# Altium footprint library Connectors.PcbLib: 56 footprints (part 1 of 4)
Each footprint in its own frame and in the unit in brackets; x right, y up, seen from the top. Pads: shape width x height; smd on the part's side, far side on the other; paste and mask are expansions set on the pad; w line width, h text height; cw(c..) or ccw(c..) is an arc to the next point about the centre after c.
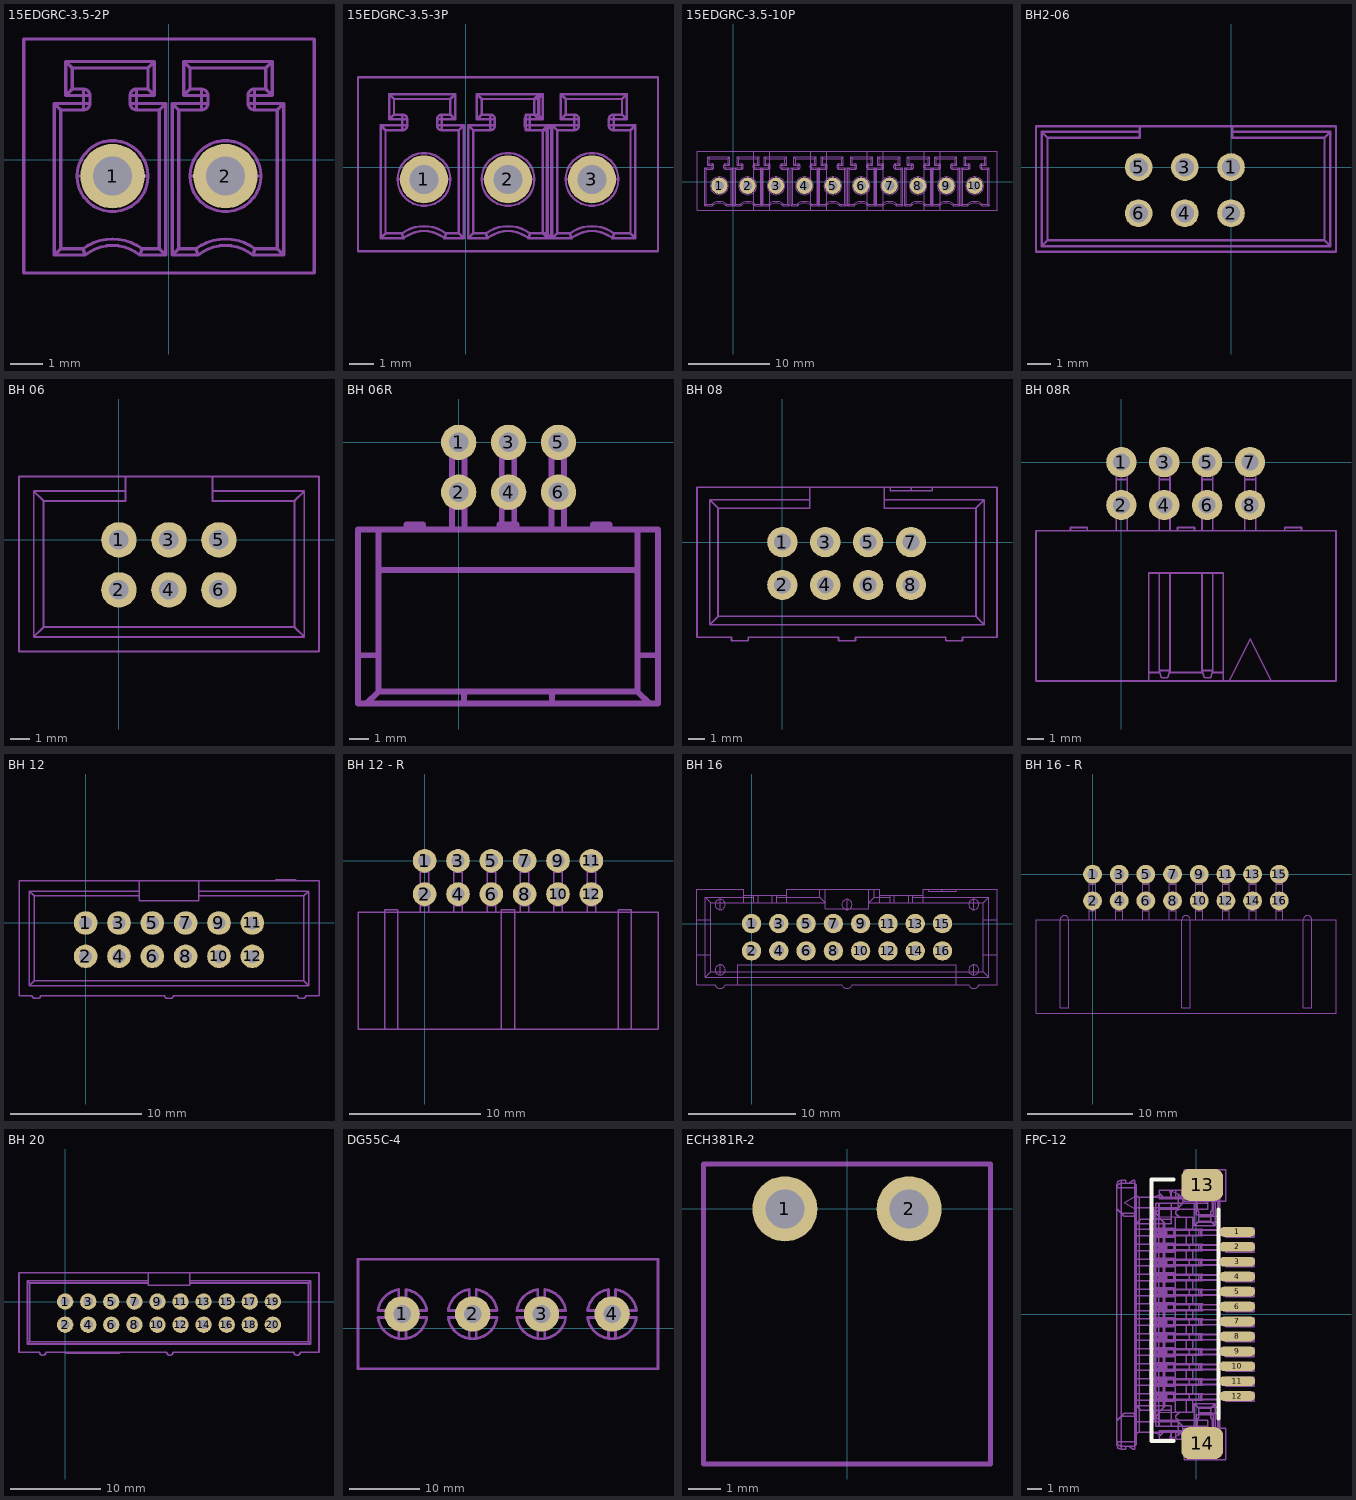
[diagram p0: the footprints below, top view; thin cyan lines are the x and y axes]

## 15EDGRC-3.5-2P [mm]
pads (2):
  round 2 hole 1.2: 1(-1.75,-0.5) 2(1.75,-0.5)
Mechanical 13:
  drawing of 660 lines, arcs and shapes, not listed
3D body "12h8910_284514-2.stp": height 9.5, standoff -3.1, extent -4.5,-3.5 4.5,3.75

## 15EDGRC-3.5-3P [mm]
pads (3):
  round 2 hole 1.2: 1(-1.75,-0.5) 2(1.75,-0.5) 3(5.25,-0.5)
Mechanical 13:
  drawing of 1141 lines, arcs and shapes, not listed
3D body "12h8910_284514-2.stp": height 9.5, standoff -3.1, extent -1,-3.5 8,3.75
3D body "12h8910_284514-2.stp": height 9.5, standoff -3.1, extent -4.5,-3.5 4.5,3.75

## 15EDGRC-3.5-10P [mm]
pads (10):
  round 2 hole 1.2: 1(-1.75,-0.5) 2(1.75,-0.5) 3(5.25,-0.5) 4(8.75,-0.5) 5(12.25,-0.5) 6(15.75,-0.5) 7(19.25,-0.5) 8(22.75,-0.5) 9(26.25,-0.5) 10(29.75,-0.5)
Mechanical 13:
  drawing of 3300 lines, arcs and shapes, not listed
3D body: height 0.25, standoff 0, extent 0,0 0,0
3D body "12h8910_284514-2.stp": height 9.5, standoff -3.1, extent -4.5,-3.5 4.5,3.75
3D body "12h8910_284514-2.stp": height 9.5, standoff -3.1, extent 2.5,-3.5 11.5,3.75
3D body "12h8910_284514-2.stp": height 9.5, standoff -3.1, extent 9.5,-3.5 18.5,3.75
3D body "12h8910_284514-2.stp": height 9.5, standoff -3.1, extent 16.5,-3.5 25.5,3.75
3D body "12h8910_284514-2.stp": height 9.5, standoff -3.1, extent 23.5,-3.5 32.5,3.75

## BH2-06 [mm]
pads (6):
  round 1.2 hole 0.8 paste-25.4: 1(0,0) 2(0,-2) 3(-2,0) 4(-2,-2) 5(-4,0) 6(-4,-2)
Mechanical 13:
  lines w0.1: 4,1.275 0.05,1.275 0.05,1.525 ; -8.2,-3.425 4.3,-3.425 ; -8.2,-3.425 -8.2,1.525 ; -8.2,-3.425 -7.95,-3.175 ; -8.2,1.525 -3.95,1.525 ; -8.2,1.525 -7.95,1.275 ; -7.95,-3.175 -7.95,1.275 ; -7.95,-3.175 4.05,-3.175 ; -7.95,1.275 -3.95,1.275 -3.95,1.525 ; -4.2,-2.2 -3.7,-2.2 ; -4.2,-2.2 -4.05,-2.05 ; -4.2,-2.2 -4.2,-1.7 ; -4.2,-1.7 -4.05,-1.85 ; -4.2,-1.7 -3.7,-1.7 ; -4.2,-0.2 -3.7,-0.2 ; -4.2,-0.2 -4.05,-0.05 ; -4.2,-0.2 -4.2,0.3 ; -4.2,0.3 -4.05,0.15 ; -4.2,0.3 -3.7,0.3 ; -4.05,-2.05 -3.85,-2.05 ; -4.05,-2.05 -4.05,-1.85 ; -4.05,-1.85 -3.85,-1.85 ; -4.05,-0.05 -3.85,-0.05 ; -4.05,-0.05 -4.05,0.15 ; -4.05,0.15 -3.85,0.15 ; -3.95,1.525 -3.95,1.775 ; -3.95,1.775 -8.45,1.775 -8.45,-3.675 4.55,-3.675 4.55,1.775 0.05,1.775 ; -3.95,1.775 0.05,1.775 ; -3.85,-2.05 -3.7,-2.2 ; -3.85,-2.05 -3.85,-1.85 ; -3.85,-1.85 -3.7,-1.7 ; -3.85,-0.05 -3.7,-0.2 ; -3.85,-0.05 -3.85,0.15 ; -3.85,0.15 -3.7,0.3 ; -3.7,-2.2 -3.7,-1.7 ; -3.7,-0.2 -3.7,0.3 ; -2.2,-2.2 -1.7,-2.2 ; -2.2,-2.2 -2.05,-2.05 ; -2.2,-2.2 -2.2,-1.7 ; -2.2,-1.7 -2.05,-1.85 ; -2.2,-1.7 -1.7,-1.7 ; -2.2,-0.2 -1.7,-0.2 ; -2.2,-0.2 -2.05,-0.05 ; -2.2,-0.2 -2.2,0.3 ; -2.2,0.3 -2.05,0.15 ; -2.2,0.3 -1.7,0.3 ; -2.05,-2.05 -1.85,-2.05 ; -2.05,-2.05 -2.05,-1.85 ; -2.05,-1.85 -1.85,-1.85 ; -2.05,-0.05 -1.85,-0.05 ; -2.05,-0.05 -2.05,0.15 ; -2.05,0.15 -1.85,0.15 ; -1.85,-2.05 -1.7,-2.2 ; -1.85,-2.05 -1.85,-1.85 ; -1.85,-1.85 -1.7,-1.7 ; -1.85,-0.05 -1.7,-0.2 ; -1.85,-0.05 -1.85,0.15 ; -1.85,0.15 -1.7,0.3 ; -1.7,-2.2 -1.7,-1.7 ; -1.7,-0.2 -1.7,0.3 ; -0.2,-2.2 -0.2,-1.7 ; -0.2,-2.2 -0.05,-2.05 ; -0.2,-2.2 0.3,-2.2 ; -0.2,-1.7 -0.05,-1.85 ; -0.2,-1.7 0.3,-1.7 ; -0.2,-0.2 -0.2,0.3 ; -0.2,-0.2 -0.05,-0.05 ; -0.2,-0.2 0.3,-0.2 ; -0.2,0.3 -0.05,0.15 ; -0.2,0.3 0.3,0.3 ; -0.05,-2.05 -0.05,-1.85 ; -0.05,-2.05 0.15,-2.05 ; -0.05,-1.85 0.15,-1.85 ; -0.05,-0.05 -0.05,0.15 ; -0.05,-0.05 0.15,-0.05 ; -0.05,0.15 0.15,0.15 ; 0.05,1.525 4.3,1.525 ; 0.05,1.525 0.05,1.775 ; 0.15,-2.05 0.3,-2.2 ; 0.15,-2.05 0.15,-1.85 ; 0.15,-1.85 0.3,-1.7 ; 0.15,-0.05 0.3,-0.2 ; 0.15,-0.05 0.15,0.15 ; 0.15,0.15 0.3,0.3 ; 0.3,-2.2 0.3,-1.7 ; 0.3,-0.2 0.3,0.3 ; 4.05,-3.175 4.3,-3.425 ; 4.05,-3.175 4.05,1.275 4.3,1.525 ; 4.3,-3.425 4.3,1.525

## BH 06 [mm]
pads (6):
  round 1.8 hole 1 paste-25.4: 1(0,0) 2(0,-2.54) 3(2.54,0) 4(2.54,-2.54) 5(5.08,0) 6(5.08,-2.54)
Mechanical 13:
  lines w0.1: -4.325,-4.928 -4.325,2.472 ; -4.325,-4.928 9.415,-4.928 ; -4.325,-4.928 -3.825,-4.428 ; -4.325,2.472 0.345,2.472 ; -4.325,2.472 -3.825,1.972 ; -3.825,-4.428 -3.825,1.972 ; -3.825,-4.428 8.915,-4.428 ; -3.825,1.972 0.345,1.972 0.345,2.472 ; -0.315,-2.818 -0.187,-2.69 ; -0.315,-2.818 0.325,-2.818 ; -0.315,-2.818 -0.315,-2.178 ; -0.315,-2.178 -0.187,-2.306 ; -0.315,-2.178 0.325,-2.178 ; -0.315,-0.278 -0.187,-0.15 ; -0.315,-0.278 0.325,-0.278 ; -0.315,-0.278 -0.315,0.362 ; -0.315,0.362 -0.187,0.234 ; -0.315,0.362 0.325,0.362 ; -0.187,-2.69 0.197,-2.69 ; -0.187,-2.69 -0.187,-2.306 ; -0.187,-2.306 0.197,-2.306 ; -0.187,-0.15 0.197,-0.15 ; -0.187,-0.15 -0.187,0.234 ; -0.187,0.234 0.197,0.234 ; 0.197,-2.69 0.325,-2.818 ; 0.197,-2.69 0.197,-2.306 ; 0.197,-2.306 0.325,-2.178 ; 0.197,-0.15 0.325,-0.278 ; 0.197,-0.15 0.197,0.234 ; 0.197,0.234 0.325,0.362 ; 0.325,-2.818 0.325,-2.178 ; 0.325,-0.278 0.325,0.362 ; 0.345,2.472 0.345,3.222 ; 0.345,3.222 -5.075,3.222 -5.075,-5.678 10.165,-5.678 10.165,3.222 4.745,3.222 ; 0.345,3.222 4.745,3.222 ; 2.225,-2.818 2.353,-2.69 ; 2.225,-2.818 2.865,-2.818 ; 2.225,-2.818 2.225,-2.178 ; 2.225,-2.178 2.353,-2.306 ; 2.225,-2.178 2.865,-2.178 ; 2.225,-0.278 2.353,-0.15 ; 2.225,-0.278 2.865,-0.278 ; 2.225,-0.278 2.225,0.362 ; 2.225,0.362 2.353,0.234 ; 2.225,0.362 2.865,0.362 ; 2.353,-2.69 2.737,-2.69 ; 2.353,-2.69 2.353,-2.306 ; 2.353,-2.306 2.737,-2.306 ; 2.353,-0.15 2.737,-0.15 ; 2.353,-0.15 2.353,0.234 ; 2.353,0.234 2.737,0.234 ; 2.737,-2.69 2.865,-2.818 ; 2.737,-2.69 2.737,-2.306 ; 2.737,-2.306 2.865,-2.178 ; 2.737,-0.15 2.865,-0.278 ; 2.737,-0.15 2.737,0.234 ; 2.737,0.234 2.865,0.362 ; 2.865,-2.818 2.865,-2.178 ; 2.865,-0.278 2.865,0.362 ; 4.745,2.472 9.415,2.472 ; 4.745,2.472 4.745,3.222 ; 4.745,2.472 4.745,1.972 8.915,1.972 ; 4.765,-2.818 4.893,-2.69 ; 4.765,-2.818 5.405,-2.818 ; 4.765,-2.818 4.765,-2.178 ; 4.765,-2.178 4.893,-2.306 ; 4.765,-2.178 5.405,-2.178 ; 4.765,-0.278 4.893,-0.15 ; 4.765,-0.278 5.405,-0.278 ; 4.765,-0.278 4.765,0.362 ; 4.765,0.362 4.893,0.234 ; 4.765,0.362 5.405,0.362 ; 4.893,-2.69 5.277,-2.69 ; 4.893,-2.69 4.893,-2.306 ; 4.893,-2.306 5.277,-2.306 ; 4.893,-0.15 5.277,-0.15 ; 4.893,-0.15 4.893,0.234 ; 4.893,0.234 5.277,0.234 ; 5.277,-2.69 5.405,-2.818 ; 5.277,-2.69 5.277,-2.306 ; 5.277,-2.306 5.405,-2.178 ; 5.277,-0.15 5.405,-0.278 ; 5.277,-0.15 5.277,0.234 ; 5.277,0.234 5.405,0.362 ; 5.405,-2.818 5.405,-2.178 ; 5.405,-0.278 5.405,0.362 ; 8.915,-4.428 9.415,-4.928 ; 8.915,-4.428 8.915,1.972 ; 8.915,1.972 9.415,2.472 ; 9.415,-4.928 9.415,2.472
3D body "User Library-BH_06.STEP": height 9.73, standoff -2.37, extent -5.08,-5.678 10.16,3.222

## BH 06R [mm]
pads (6):
  round 1.8 hole 1 paste-25.4: 1(0,0) 2(0,-2.54) 3(2.54,0) 4(2.54,-2.54) 5(5.08,0) 6(5.08,-2.54)
Mechanical 13:
  lines w0.3: -5.13,-10.845 -4.08,-10.845 ; -4.68,-13.295 -4.08,-12.695 ; -4.08,-4.445 -4.08,-6.495 ; -2.665,-4.445 -2.665,-4.195 -1.815,-4.195 -1.815,-4.445 ; -0.35,-4.445 -0.35,-3.285 ; 0.26,-13.295 0.26,-12.695 -4.08,-12.695 ; 0.29,-4.445 0.29,-3.285 ; 2.085,-4.445 2.085,-4.195 2.935,-4.195 2.935,-4.445 ; 2.19,-4.195 2.19,-3.285 ; 2.83,-4.195 2.83,-3.285 ; 4.73,-4.445 4.73,-3.285 ; 4.76,-13.295 4.76,-12.695 9.1,-12.695 ; 5.37,-4.445 5.37,-3.285 ; 6.835,-4.445 6.835,-4.195 7.685,-4.195 7.685,-4.445 ; 9.1,-10.845 10.15,-10.845 ; 9.1,-4.445 9.1,-6.495 ; 9.7,-13.295 9.1,-12.695 ; -4.08,-12.695 -4.08,-6.495 ; -4.08,-12.695 9.1,-12.695 ; -4.08,-6.495 9.1,-6.495 ; -0.35,-3.285 0.29,-3.285 ; -0.35,-3.285 -0.35,-2.925 ; -0.35,-3.285 0.29,-3.285 ; -0.35,-2.925 -0.15,-2.725 ; -0.35,-2.925 0.29,-2.925 ; -0.35,-2.925 -0.35,-2.285 ; -0.35,-2.285 -0.35,-0.745 ; -0.35,-2.285 -0.15,-2.485 ; -0.35,-2.285 0.29,-2.285 ; -0.35,-0.745 0.29,-0.745 ; -0.35,-0.745 -0.35,-0.385 ; -0.35,-0.745 0.29,-0.745 ; -0.35,-0.385 0.29,-0.385 ; -0.35,-0.385 -0.15,-0.185 ; -0.35,-0.385 -0.35,0.255 ; -0.35,0.255 -0.15,0.055 ; -0.35,0.255 0.29,0.255 ; -0.15,-2.725 -0.15,-2.485 ; -0.15,-2.725 0.09,-2.725 ; -0.15,-2.485 0.09,-2.485 ; -0.15,-0.185 0.09,-0.185 ; -0.15,-0.185 -0.15,0.055 ; -0.15,0.055 0.09,0.055 ; 0.09,-2.725 0.09,-2.485 ; 0.09,-2.725 0.29,-2.925 ; 0.09,-2.485 0.29,-2.285 ; 0.09,-0.185 0.29,-0.385 ; 0.09,-0.185 0.09,0.055 ; 0.09,0.055 0.29,0.255 ; 0.29,-3.285 0.29,-2.925 ; 0.29,-2.925 0.29,-2.285 ; 0.29,-2.285 0.29,-0.745 ; 0.29,-0.745 0.29,-0.385 ; 0.29,-0.385 0.29,0.255 ; 2.19,-3.285 2.83,-3.285 ; 2.19,-3.285 2.19,-2.925 ; 2.19,-3.285 2.83,-3.285 ; 2.19,-2.925 2.39,-2.725 ; 2.19,-2.925 2.83,-2.925 ; 2.19,-2.925 2.19,-2.285 ; 2.19,-2.285 2.19,-0.745 ; 2.19,-2.285 2.39,-2.485 ; 2.19,-2.285 2.83,-2.285 ; 2.19,-0.745 2.83,-0.745 ; 2.19,-0.745 2.19,-0.385 ; 2.19,-0.745 2.83,-0.745 ; 2.19,-0.385 2.83,-0.385 ; 2.19,-0.385 2.39,-0.185 ; 2.19,-0.385 2.19,0.255 ; 2.19,0.255 2.39,0.055 ; 2.19,0.255 2.83,0.255 ; 2.39,-2.725 2.39,-2.485 ; 2.39,-2.725 2.63,-2.725 ; 2.39,-2.485 2.63,-2.485 ; 2.39,-0.185 2.63,-0.185 ; 2.39,-0.185 2.39,0.055 ; 2.39,0.055 2.63,0.055 ; 2.63,-2.725 2.63,-2.485 ; 2.63,-2.725 2.83,-2.925 ; 2.63,-2.485 2.83,-2.285 ; 2.63,-0.185 2.83,-0.385 ; 2.63,-0.185 2.63,0.055 ; 2.63,0.055 2.83,0.255 ; 2.83,-3.285 2.83,-2.925 ; 2.83,-2.925 2.83,-2.285 ; 2.83,-2.285 2.83,-0.745 ; 2.83,-0.745 2.83,-0.385 ; 2.83,-0.385 2.83,0.255 ; 4.73,-3.285 5.37,-3.285 ; 4.73,-3.285 4.73,-2.925 ; 4.73,-3.285 5.37,-3.285 ; 4.73,-2.925 4.93,-2.725 ; 4.73,-2.925 5.37,-2.925 ; 4.73,-2.925 4.73,-2.285 ; 4.73,-2.285 4.73,-0.745 ; 4.73,-2.285 4.93,-2.485 ; 4.73,-2.285 5.37,-2.285 ; 4.73,-0.745 5.37,-0.745 ; 4.73,-0.745 4.73,-0.385 ; 4.73,-0.745 5.37,-0.745 ; 4.73,-0.385 5.37,-0.385 ; 4.73,-0.385 4.93,-0.185 ; 4.73,-0.385 4.73,0.255 ; 4.73,0.255 4.93,0.055 ; 4.73,0.255 5.37,0.255 ; 4.93,-2.725 4.93,-2.485 ; 4.93,-2.725 5.17,-2.725 ; 4.93,-2.485 5.17,-2.485 ; 4.93,-0.185 5.17,-0.185 ; 4.93,-0.185 4.93,0.055 ; 4.93,0.055 5.17,0.055 ; 5.17,-2.725 5.17,-2.485 ; 5.17,-2.725 5.37,-2.925 ; 5.17,-2.485 5.37,-2.285 ; 5.17,-0.185 5.37,-0.385 ; 5.17,-0.185 5.17,0.055 ; 5.17,0.055 5.37,0.255 ; 5.37,-3.285 5.37,-2.925 ; 5.37,-2.925 5.37,-2.285 ; 5.37,-2.285 5.37,-0.745 ; 5.37,-0.745 5.37,-0.385 ; 5.37,-0.385 5.37,0.255 ; 9.1,-12.695 9.1,-6.495 ; -5.13,-13.295 -5.13,-4.445 -2.98,-4.445 -2.33,-4.445 7.35,-4.445 8,-4.445 10.15,-4.445 10.15,-13.295 8,-13.295 7.35,-13.295 -2.33,-13.295 -2.98,-13.295 -5.13,-13.295
3D body "65715.stp": height 9.43, standoff -2.4, extent -5.1,-13.295 10.18,0.255

## BH 08 [mm]
pads (8):
  round 1.8 hole 1: 1(0,0) 2(0,-2.54) 3(2.54,0) 4(2.54,-2.54) 5(5.08,0) 6(5.08,-2.54) 7(7.62,0) 8(7.62,-2.54)
Mechanical 13:
  lines w0.1: 7.639,3.054 7.639,3.254 ; -4.311,-4.896 -3.811,-4.396 ; -4.311,-4.896 11.969,-4.896 ; -4.311,-4.896 -4.311,2.504 ; -4.311,2.504 -3.811,2.004 ; -4.311,2.504 1.629,2.504 ; -3.811,-4.396 11.469,-4.396 ; -3.811,-4.396 -3.811,2.004 ; -3.811,2.004 1.629,2.004 1.629,2.504 ; -0.301,-2.786 0.339,-2.786 ; -0.301,-2.786 -0.301,-2.146 ; -0.301,-2.786 -0.173,-2.658 ; -0.301,-2.146 0.339,-2.146 ; -0.301,-2.146 -0.173,-2.274 ; -0.301,-0.246 -0.301,0.394 ; -0.301,-0.246 0.339,-0.246 ; -0.301,-0.246 -0.173,-0.118 ; -0.301,0.394 0.339,0.394 ; -0.301,0.394 -0.173,0.266 ; -0.173,-2.658 0.211,-2.658 ; -0.173,-2.658 -0.173,-2.274 ; -0.173,-2.274 0.211,-2.274 ; -0.173,-0.118 -0.173,0.266 ; -0.173,-0.118 0.211,-0.118 ; -0.173,0.266 0.211,0.266 ; 0.211,-2.658 0.339,-2.786 ; 0.211,-2.658 0.211,-2.274 ; 0.211,-2.274 0.339,-2.146 ; 0.211,-0.118 0.211,0.266 ; 0.211,-0.118 0.339,-0.246 ; 0.211,0.266 0.339,0.394 ; 0.339,-2.786 0.339,-2.146 ; 0.339,-0.246 0.339,0.394 ; 1.629,2.504 1.629,3.254 ; 1.629,3.254 6.029,3.254 ; 1.629,3.254 -5.061,3.254 -5.061,-5.646 -3.021,-5.646 -3.021,-5.846 -2.021,-5.846 -2.021,-5.646 3.329,-5.646 3.329,-5.846 4.329,-5.846 4.329,-5.646 9.679,-5.646 9.679,-5.846 10.679,-5.846 10.679,-5.646 12.719,-5.646 12.719,3.254 8.889,3.254 ; 2.239,-2.786 2.879,-2.786 ; 2.239,-2.786 2.239,-2.146 ; 2.239,-2.786 2.367,-2.658 ; 2.239,-2.146 2.879,-2.146 ; 2.239,-2.146 2.367,-2.274 ; 2.239,-0.246 2.879,-0.246 ; 2.239,-0.246 2.239,0.394 ; 2.239,-0.246 2.367,-0.118 ; 2.239,0.394 2.879,0.394 ; 2.239,0.394 2.367,0.266 ; 2.367,-2.658 2.367,-2.274 ; 2.367,-2.658 2.751,-2.658 ; 2.367,-2.274 2.751,-2.274 ; 2.367,-0.118 2.751,-0.118 ; 2.367,-0.118 2.367,0.266 ; 2.367,0.266 2.751,0.266 ; 2.751,-2.658 2.879,-2.786 ; 2.751,-2.658 2.751,-2.274 ; 2.751,-2.274 2.879,-2.146 ; 2.751,-0.118 2.879,-0.246 ; 2.751,-0.118 2.751,0.266 ; 2.751,0.266 2.879,0.394 ; 2.879,-2.786 2.879,-2.146 ; 2.879,-0.246 2.879,0.394 ; 4.779,-2.786 5.419,-2.786 ; 4.779,-2.786 4.779,-2.146 ; 4.779,-2.786 4.907,-2.658 ; 4.779,-2.146 5.419,-2.146 ; 4.779,-2.146 4.907,-2.274 ; 4.779,-0.246 5.419,-0.246 ; 4.779,-0.246 4.779,0.394 ; 4.779,-0.246 4.907,-0.118 ; 4.779,0.394 5.419,0.394 ; 4.779,0.394 4.907,0.266 ; 4.907,-2.658 4.907,-2.274 ; 4.907,-2.658 5.291,-2.658 ; 4.907,-2.274 5.291,-2.274 ; 4.907,-0.118 4.907,0.266 ; 4.907,-0.118 5.291,-0.118 ; 4.907,0.266 5.291,0.266 ; 5.291,-2.658 5.419,-2.786 ; 5.291,-2.658 5.291,-2.274 ; 5.291,-2.274 5.419,-2.146 ; 5.291,-0.118 5.419,-0.246 ; 5.291,-0.118 5.291,0.266 ; 5.291,0.266 5.419,0.394 ; 5.419,-2.786 5.419,-2.146 ; 5.419,-0.246 5.419,0.394 ; 6.029,2.504 6.029,2.004 11.469,2.004 ; 6.029,2.504 6.029,3.254 ; 6.029,2.504 11.969,2.504 ; 6.029,3.254 6.389,3.254 ; 6.389,3.254 7.639,3.254 ; 6.389,3.254 6.389,3.054 8.889,3.054 8.889,3.254 ; 7.319,-2.786 7.959,-2.786 ; 7.319,-2.786 7.319,-2.146 ; 7.319,-2.786 7.447,-2.658 ; 7.319,-2.146 7.959,-2.146 ; 7.319,-2.146 7.447,-2.274 ; 7.319,-0.246 7.959,-0.246 ; 7.319,-0.246 7.319,0.394 ; 7.319,-0.246 7.447,-0.118 ; 7.319,0.394 7.959,0.394 ; 7.319,0.394 7.447,0.266 ; 7.447,-2.658 7.831,-2.658 ; 7.447,-2.658 7.447,-2.274 ; 7.447,-2.274 7.831,-2.274 ; 7.447,-0.118 7.447,0.266 ; 7.447,-0.118 7.831,-0.118 ; 7.447,0.266 7.831,0.266 ; 7.639,3.254 8.889,3.254 ; 7.831,-2.658 7.831,-2.274 ; 7.831,-2.658 7.959,-2.786 ; 7.831,-2.274 7.959,-2.146 ; 7.831,-0.118 7.831,0.266 ; 7.831,-0.118 7.959,-0.246 ; 7.831,0.266 7.959,0.394 ; 7.959,-2.786 7.959,-2.146 ; 7.959,-0.246 7.959,0.394 ; 11.469,-4.396 11.469,2.004 ; 11.469,-4.396 11.969,-4.896 ; 11.469,2.004 11.969,2.504 ; 11.969,-4.896 11.969,2.504
3D body "User Library-BH_08_V.STEP": height 8.9, standoff -3.2, extent -5.04,-5.9 12.74,3.2

## BH 08R [mm]
pads (8):
  round 1.8 hole 1: 1(0,0) 2(0,-2.54) 3(2.54,0) 4(2.54,-2.54) 5(5.08,0) 6(5.08,-2.54) 7(7.62,0) 8(7.62,-2.54)
Mechanical 13:
  lines w0.1: -3.021,-4.07 -3.021,-3.87 -2.021,-3.87 -2.021,-4.07 ; -0.301,-4.07 -0.301,-1.03 ; 0.339,-4.07 0.339,-1.03 ; 1.629,-12.47 2.277,-12.47 ; 2.239,-6.57 2.239,-12.343 ; 2.239,-4.07 2.239,-1.03 ; 2.841,-12.47 4.817,-12.47 ; 2.879,-6.57 2.879,-12.343 ; 2.879,-4.07 2.879,-1.03 ; 3.329,-4.07 3.329,-3.87 4.329,-3.87 4.329,-4.07 ; 4.779,-6.57 4.779,-12.343 ; 4.779,-4.07 4.779,-1.03 ; 5.381,-12.47 6.029,-12.47 ; 5.419,-6.57 5.419,-12.343 ; 5.419,-4.07 5.419,-1.03 ; 7.319,-4.07 7.319,-1.03 ; 7.959,-4.07 7.959,-1.03 ; 9.679,-4.07 9.679,-3.87 10.679,-3.87 10.679,-4.07 ; -0.301,-1.03 0.339,-1.03 ; -0.301,-1.03 -0.301,0.25 0.339,0.25 0.339,-1.03 ; 1.629,-12.97 6.029,-12.97 ; 1.629,-12.97 -5.061,-12.97 -5.061,-4.07 12.719,-4.07 12.719,-12.97 8.889,-12.97 ; 1.629,-12.97 1.629,-6.57 6.029,-6.57 6.029,-12.97 ; 2.239,-12.343 2.367,-12.77 2.751,-12.77 2.879,-12.343 ; 2.239,-12.343 2.879,-12.343 ; 2.239,-1.03 2.879,-1.03 ; 2.239,-1.03 2.239,0.25 2.879,0.25 2.879,-1.03 ; 4.779,-12.343 4.907,-12.77 5.291,-12.77 5.419,-12.343 ; 4.779,-12.343 5.419,-12.343 ; 4.779,-1.03 5.419,-1.03 ; 4.779,-1.03 4.779,0.25 5.419,0.25 5.419,-1.03 ; 6.029,-12.97 6.389,-12.97 ; 6.389,-12.97 8.889,-12.97 ; 6.389,-12.97 7.639,-10.47 8.889,-12.97 ; 7.319,-1.03 7.959,-1.03 ; 7.319,-1.03 7.319,0.25 7.959,0.25 7.959,-1.03
3D body "User Library-BH_08_H.STEP": height 9.45, standoff -2.62, extent -5.061,-12.97 12.719,0.25

## BH 12 [mm]
pads (12):
  round 1.8 hole 1: 1(0,0) 2(0,-2.54) 3(2.54,0) 4(2.54,-2.54) 5(5.08,0) 6(5.08,-2.54) 7(7.62,0) 8(7.62,-2.54) 9(10.16,0) 10(10.16,-2.54) 11(12.7,0) 12(12.7,-2.54)
Mechanical 13:
  drawing of 186 lines, arcs and shapes, not listed
3D body "User Library-BH-12.STEP": height 9.1, standoff -3.1, extent -5.1,-5.745 17.76,3.305

## BH 12 - R [mm]
pads (12):
  round 1.8 hole 1: 1(0,0) 2(0,-2.54) 3(2.54,0) 4(2.54,-2.54) 5(5.08,0) 6(5.08,-2.54) 7(7.62,0) 8(7.62,-2.54) 9(10.16,0) 10(10.16,-2.54) 11(12.7,0) 12(12.7,-2.54)
Mechanical 13:
  drawing of 379 lines, arcs and shapes, not listed
3D body "User Library-BH_12_H.STEP": height 9.45, standoff -2.62, extent -5.08,-12.966 17.78,0.254

## BH 16 [mm]
pads (16):
  round 1.8 hole 1: 1(0,0) 2(0,-2.54) 3(2.54,0) 4(2.54,-2.54) 5(5.08,0) 6(5.08,-2.54) 7(7.62,0) 8(7.62,-2.54) 9(10.16,0) 10(10.16,-2.54) 11(12.7,0) 12(12.7,-2.54) 13(15.24,0) 14(15.24,-2.54) 15(17.78,0) 16(17.78,-2.54)
Mechanical 13:
  drawing of 173 lines, arcs and shapes, not listed
3D body "2-1761603-6.stp": height 10, standoff -1.81, extent -5.08,-6.045 22.86,3.175

## BH 16 - R [mm]
pads (16):
  round 1.8 hole 1: 1(0,0) 2(0,-2.54) 3(2.54,0) 4(2.54,-2.54) 5(5.08,0) 6(5.08,-2.54) 7(7.62,0) 8(7.62,-2.54) 9(10.16,0) 10(10.16,-2.54) 11(12.7,0) 12(12.7,-2.54) 13(15.24,0) 14(15.24,-2.54) 15(17.78,0) 16(17.78,-2.54)
Mechanical 13:
  drawing of 294 lines, arcs and shapes, not listed
3D body "User Library-IDC Socket Male 16pin Angled THT Goldplated 2_54mm.step": height 9.98, standoff -1.37, extent -5.39,-13.335 23.17,0.225

## BH 20 [mm]
pads (20):
  round 1.8 hole 1: 1(0,0) 2(0,-2.54) 3(2.54,0) 4(2.54,-2.54) 5(5.08,0) 6(5.08,-2.54) 7(7.62,0) 8(7.62,-2.54) 9(10.16,0) 10(10.16,-2.54) 11(12.7,0) 12(12.7,-2.54) 13(15.24,0) 14(15.24,-2.54) 15(17.78,0) 16(17.78,-2.54) 17(20.32,0) 18(20.32,-2.54) 19(22.86,0) 20(22.86,-2.54)
Mechanical 13:
  drawing of 276 lines, arcs and shapes, not listed
3D body "User Library-BH-20.step": height 9.35, standoff -2.5, extent -5.01,-5.95 28.01,3.15

## DG55C-4 [mm]
pads (4):
  round 5 hole 2.5 paste-25.4: 1(-71,2) 2(-61,2) 3(-51.25,2) 4(-41.25,2)
Mechanical 13:
  lines w0.4: -74.428,1.5 ccw(c-70.964,1.995) -71.47,-1.468 ccw(c-70.964,1.995) -70.47,-1.47 ccw(c-70.964,1.995) -67.499,1.5 ; -74.427,1.5 -71.47,1.5 -71.47,-1.466 ; -74.427,2.5 cw(c-70.964,1.995) -71.47,5.459 ; -74.426,2.5 -71.47,2.5 -71.47,5.457 ; -70.47,-1.468 -70.47,1.5 -67.5,1.5 ; -70.47,5.459 -70.47,2.5 -67.501,2.5 ; -70.47,5.46 cw(c-70.964,1.995) -67.5,2.5 ; -64.47,2.5 cw(c-61.006,2.002) -61.5,5.467 ; -64.469,1.5 ccw(c-61.006,2.002) -61.5,-1.462 ccw(c-61.006,2.002) -60.5,-1.461 ccw(c-61.006,2.002) -57.542,1.5 ; -64.469,2.5 -61.5,2.5 -61.5,5.466 ; -64.468,1.5 -61.5,1.5 -61.5,-1.461 ; -60.5,-1.46 -60.5,1.5 -57.543,1.5 ; -60.5,5.464 -60.5,2.5 -57.542,2.5 ; -60.5,5.466 cw(c-61.006,2.002) -57.541,2.5 ; -54.75,1.5 ccw(c-51.285,1.995) -51.792,-1.468 ccw(c-51.285,1.995) -50.792,-1.47 ; -54.749,1.5 -51.792,1.5 -51.792,-1.466 ; -54.748,2.5 cw(c-51.285,1.995) -51.792,5.459 ; -54.747,2.5 -51.792,2.5 -51.792,5.457 ; -50.792,-1.468 -50.792,1.5 -47.821,1.5 ; -50.792,5.459 -50.792,2.5 -47.823,2.5 ; -50.792,-1.47 ccw(c-51.285,1.995) -47.82,1.5 ; -50.792,5.46 cw(c-51.285,1.995) -47.822,2.5 ; -44.72,2.5 cw(c-41.256,2.002) -41.75,5.467 ; -44.719,1.5 ccw(c-41.256,2.002) -41.75,-1.462 ccw(c-41.256,2.002) -40.75,-1.461 ccw(c-41.256,2.002) -37.792,1.5 ; -44.719,2.5 -41.75,2.5 -41.75,5.466 ; -44.718,1.5 -41.75,1.5 -41.75,-1.461 ; -40.75,-1.46 -40.75,1.5 -37.793,1.5 ; -40.75,5.464 -40.75,2.5 -37.792,2.5 ; -40.75,5.466 cw(c-41.256,2.002) -37.791,2.5 ; -77.25,-5.75 -77.25,9.75 -34.75,9.75 -34.75,-5.75 -38.75,-5.75 -77.25,-5.75
3D body "User Library-Screw terminal block 9_5mm.SLDPRT": height 18.5, standoff -5, extent -77.525,-6 -56.475,10.5
3D body "User Library-Screw terminal block 9_5mm.SLDPRT": height 18.5, standoff -5, extent -55.525,-6 -34.475,10.5

## ECH381R-2 [mm]
pads (2):
  round 2 hole 1.2: 1(-1.905,0) 2(1.905,0)
Mechanical 13:
  lines w0.15: -4.405,-7.823 -4.405,1.377 4.405,1.377 4.405,-7.823 -4.405,-7.823
3D body "20020110d021a01lf.stp": height 7.72, standoff -3.4, extent -4.405,-7.823 4.405,1.377

## FPC-12 [mm]
pads (14):
  oval 2.4x0.66 smd: 1(2.75,5.5) 2(2.75,4.5) 3(2.75,3.5) 4(2.75,2.5) 5(2.75,1.5) 6(2.75,0.5) 7(2.75,-0.5) 8(2.75,-1.5) 9(2.75,-2.5) 10(2.75,-3.5) 11(2.75,-4.5) 12(2.75,-5.5)
  rrect50% 2.794x2.134 smd: 13(0.4,8.65) 14(0.4,-8.65)
Top Overlay:
  lines w0.254: -1.5,-8.5 -3,-8.5 -3,9 -1.5,9 ; 1.5,-7 1.5,7
Mechanical 13:
  drawing of 1775 lines, arcs and shapes, not listed
3D body "5549.stp": height 2.85, standoff 0.15, extent -5,-9.15 3.9,9.15